# Altium integrated library PlantiumIntegratedLibrary.IntLib: 638 symbols (part 2 of 6)
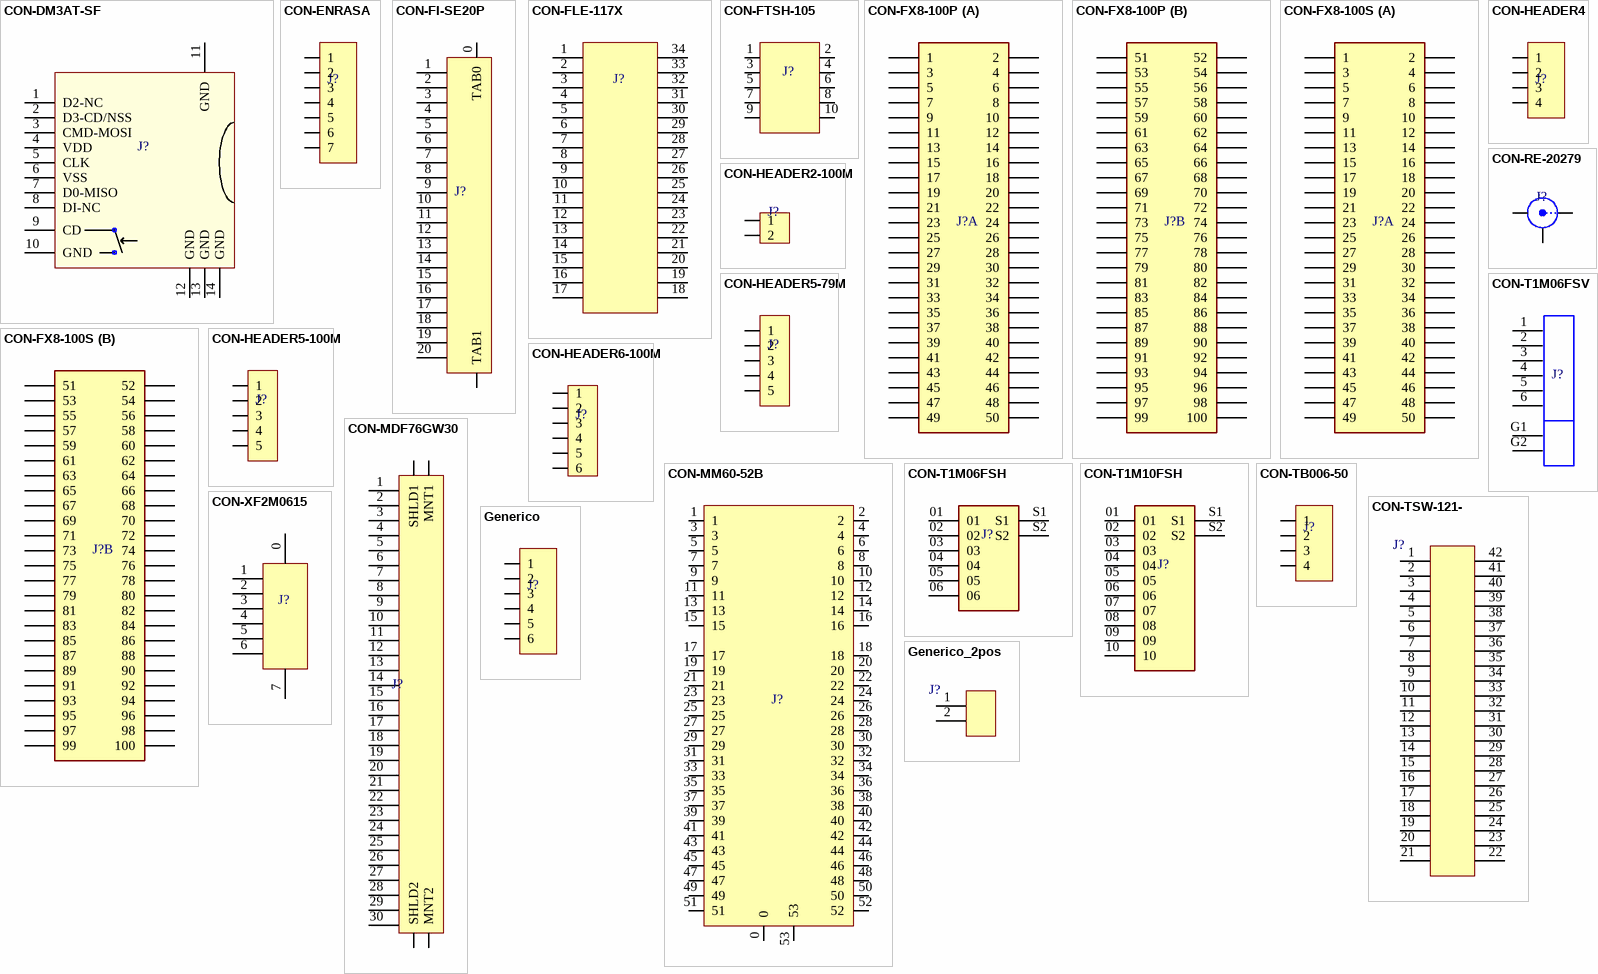
[diagram p35: symbols CON-DM3AT-SF to Generico_2pos]

## CON-MDF76GW30
designator J?
30 Position Receptacle Connector 0.039" (1.00mm) Surface Mount, Right Angle Gold; Manufacturer Part Number: MDF76GW-30S-1H(55); Manufacturer: Hirose Electric Co Ltd; Working Temperature: -40°C ~ 85°C; Temperature Coefficient: NC; Short Description: CONN RCPT 30P 0.039 GOLD SMD R/A; Ratings: ROHS; Value: 30; Mounting: SMT; Power: NC; Type: NC; Frequency: NC; Alternate Part Number 1: NC; Alternate Part Number 2: NC; Tolerance: NC; Current: NC; Revision Date: 19/11/21; Package Reference: NC; Voltage: NC
footprint MDF76GW-30S-1H(55)
pins: 1, 2, 3, 4, 5, 6, 7, 8, 9, 10, 11, 12, 13, 14, 15, 16, 17, 18, 19, 20, 21, 22, 23, 24, 25, 26, 27, 28, 29, 30, 31 MNT1, 31 MNT2, 31 SHLD1, 31 SHLD2

## CON-MM60-52B
designator J?
52 Position Female Connector PCI Express Mini Card Gold 0.031" (0.80mm) -; Manufacturer Part Number: MM60-52B1-E1-R650; Manufacturer: JAE Electronics; Working Temperature: -40°C ~ 85°C; Temperature Coefficient: NC; Short Description: CONN PCI EXP MINI FEMALE 52POS; Ratings: ROHS; Value: 52; Mounting: SMT; Power: NC; Type: NC; Frequency: NC; Alternate Part Number 2: *; Tolerance: NC; Current: NC; Revision Date: 03/08/21; Package Reference: NC; Voltage: NC
footprint MM60-52B1-E1-R650
pins: 0, 1, 2, 3, 4, 5, 6, 7, 8, 9, 10, 11, 12, 13, 14, 15, 16, 17, 18, 19, 20, 21, 22, 23, 24, 25, 26, 27, 28, 29, 30, 31, 32, 33, 34, 35, 36, 37, 38, 39, 40, 41, 42, 43, 44, 45, 46, 47, 48, 49, 50, 51, 52, 53

## CON-RE-20279
designator J?
U.FL (UMCC), IPEX MHF1 Connector Receptacle, Male Pin 50Ohm Surface Mount Solder; Manufacturer Part Number: RECE.20279.001E.01; Manufacturer: Taoglas Limited; Working Temperature: -40°C ~ 90°C; Temperature Coefficient: NC; Short Description: CONN UMC RCPT STR 50 OHM SMD; Ratings: REACH, ROHS3; Frequency: 6GHz; Value: 1; Mounting: SMT; Power: NC; Type: Male; Alternate Part Number 2: *; Tolerance: NC; Current: NC; Revision Date: 03/08/21; Package Reference: NC; Voltage: NC
footprint RECE-20279-001E-01
pins: 1 GND, 2 PIN, 3 GND

## CON-T1M06FSH
designator J?
Connector Header Surface Mount, Right Angle 6 position 0.039" (1.00mm); Manufacturer Part Number: T1M-06-F-SH-L-K; Manufacturer: Samtec Inc.; Working Temperature: -55°C ~ 85°C; Temperature Coefficient: NC; Short Description: CONN HEADER SMD R/A 6POS 1MM; Ratings: REACH, ROHS3; Current: 3.3A; Voltage: 250VAC, 353VDC; Value: 6; Mounting: SMT; Power: NC; Type: NC; Frequency: NC; Alternate Part Number 2: *; Tolerance: NC; Revision Date: 02/02/22; Package Reference: NC; ComponentLink1Description: Series Datasheet; ComponentLink1URL: http://suddendocs.samtec.com/catalog_english/t1m-sx.pdf; ComponentLink2Description: Drawing; ComponentLink2URL: http://suddendocs.samtec.com/prints/t1m-xx-x-sh-l-x-mkt.pdf
footprint T1M-06-X-SH-L
pins: 01, 02, 03, 04, 05, 06, S1, S2

## CON-T1M06FSV
designator J?
Connector Header Surface Mount 6 position 0.039" (1.00mm); Manufacturer Part Number: T1M-06-F-SV-L; Manufacturer: Samtec Inc.; Working Temperature: -55°C ~ 85°C; Temperature Coefficient: NC; Short Description: CONN HEADER SMD 6POS 1MM; Ratings: REACH, ROHS3; Current: 3.3A; Voltage: 250VAC, 353VDC; Value: 6; Mounting: SMT; Power: NC; Type: NC; Frequency: NC; Alternate Part Number 2: *; Tolerance: NC; Revision Date: 03/08/21; Package Reference: NC
footprint T1M-06-F-SV-L
pins: 1, 2, 3, 4, 5, 6, G1, G2

## CON-T1M10FSH
designator J?
Connector Header Surface Mount, Right Angle 10 position 0.039" (1.00mm); Manufacturer Part Number: T1M-10-F-SH-L-K; Manufacturer: Samtec Inc.; Working Temperature: -55°C ~ 85°C; Short Description: CONN HEADER SMD R/A 10POS 1MM; Ratings: ROHS3, REACH; Current: 3.3A; Voltage: 250VAC, 353VDC; Value: 10; Temperature Coefficient: *; Mounting: SMT, R/A; Power: *; Type: Header Male Pin; Frequency: *; Alternate Part Number 1: *; Alternate Part Number 2: *; Tolerance: *; Revision Date: 02/02/2022; Package Reference: *; ComponentLink1Description: Series Datasheet; ComponentLink1URL: http://suddendocs.samtec.com/catalog_english/t1m-sx.pdf; ComponentLink2Description: Drawing; ComponentLink2URL: http://suddendocs.samtec.com/prints/t1m-xx-x-sh-l-x-mkt.pdf
footprint T1M-10-F-SH-L-K (CONN HEADER SMD R/A 10POS 1MM)
pins: 01, 02, 03, 04, 05, 06, 07, 08, 09, 10, S1, S2

## CON-TB006-50
designator J?
4 Position Wire to Board Terminal Block Horizontal with Board 0.200" (5.08mm) Through Hole; Manufacturer Part Number: TB006-508-04BE; Manufacturer: CUI Devices; Working Temperature: -40°C ~ 105°C; Short Description: TERMINAL BLOCK, SCREW TYPE, 5.08; Current: 12 A; Voltage: 300 V; Temperature Coefficient: *; Mounting: Through Hole; Power: *; Ratings: *; Type: *; Frequency: *; Alternate Part Number 1: *; Alternate Part Number 2: *; Tolerance: *; Revision Date: 06/10/2021; Package Reference: *; Value: *
footprint TB006-508-04BE (4 POS, TERMINAL BLOCK, SCREW TYPE, 5.08)
pins: 1, 2, 3, 4

## CON-TSW-121-
designator J?
Connector Header Through Hole 42 position 0.100" (2.54mm) 2 rows; Manufacturer Part Number: TSW-121-07-T-D; Manufacturer: Samtec Inc.; Value: 42; Working Temperature: *; Temperature Coefficient: *; Mounting: Through Hole; Short Description: *; Power: *; Ratings: *; Type: *; Frequency: *; Alternate Part Number 1: *; Alternate Part Number 2: *; Tolerance: *; Current: *; Revision Date: *; Package Reference: *; Voltage: *
footprint PinHeader2x21_2.54
pins: 1, 2, 3, 4, 5, 6, 7, 8, 9, 10, 11, 12, 13, 14, 15, 16, 17, 18, 19, 20, 21, 22, 23, 24, 25, 26, 27, 28, 29, 30, 31, 32, 33, 34, 35, 36, 37, 38, 39, 40, 41, 42

## CON-XF2M0615
designator J?
6 Position FPC Connector Contacts, Top and Bottom 0.020" (0.50mm) Surface Mount, Right Angle; Manufacturer Part Number: XF2M-0615-1A; Manufacturer: Omron Electronics Inc-EMC Div; Working Temperature: -30°C ~ 85°C; Temperature Coefficient: NC; Short Description: CONN FPC 6POS 0.50MM R/A; Ratings: ROHS; Current: 0.5A; Voltage: 50V; Value: 6; Mounting: SMT; Power: NC; Type: NC; Frequency: NC; Alternate Part Number 2: *; Tolerance: NC; Revision Date: 03/08/21; Package Reference: NC
footprint XF2M-0615-1A
pins: 0, 1, 2, 3, 4, 5, 6, 7

## Generico
designator J?
Manufacturer Part Number: *; Working Temperature: *; Temperature Coefficient: *; Mounting: *; Short Description: *; Power: *; Ratings: *; Type: *; Frequency: *; Alternate Part Number 1: *; Alternate Part Number 2: *; Manufacturer: *; Tolerance: *; Current: *; Revision Date: *; Package Reference: *; Voltage: *; Value: *
pins: 1, 2, 3, 4, 5, 6

## Generico_2pos
designator J?
Value: 2; Manufacturer Part Number: *; Working Temperature: *; Temperature Coefficient: *; Mounting: *; Short Description: *; Power: *; Ratings: *; Type: *; Frequency: *; Alternate Part Number 1: *; Alternate Part Number 2: *; Manufacturer: *; Tolerance: *; Current: *; Revision Date: *; Package Reference: *; Voltage: *
footprint HEADER2-100
pins: 1, 2


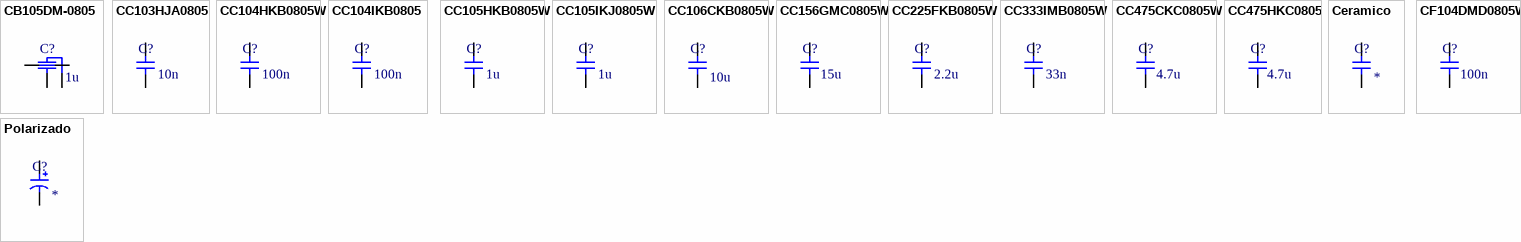
[diagram p7: symbols CB105DM-0805 to Polarizado]

## CB105DM-0805
designator C?  value 1u
Feed Through Capacitor 16V 20mOhm 0805 (2012 Metric), 3 PC Pad; Manufacturer Part Number: NFM21HC105R1C3D; Manufacturer: Murata Electronics; Working Temperature: -55°C ~ 125°C; Short Description: CAP FEEDTHRU 1UF 20% 16V 0805; Power: NC; Type: MLCC; Tolerance: 20%; Current: 4 A; Temperature Coefficient: -; Mounting: SMT; Ratings: AEC-Q200; Frequency: NC; Alternate Part Number 1: *; Alternate Part Number 2: *; Revision Date: 22/09/21; Package Reference: 0805; Voltage: 16V
footprint C0805-4PC
pins: 1, 2, 3, 4

## CC103HJA0805
designator C?  value 10n
10000 pF ±5% 50V Ceramic Capacitor C0G, NP0 0805 (2012 Metric); Manufacturer Part Number: CGA4C2C0G1H103J060AA; Manufacturer: TDK Corporation; Working Temperature: -55°C ~ 125°C; Short Description: CAP CER 10000PF 50V C0G 0805; Power: NC; Type: MLCC; Temperature Coefficient: C0G, NP0; Mounting: SMT; Ratings: AEC-Q200; Frequency: NC; Alternate Part Number 1: *; Alternate Part Number 2: *; Tolerance: ±5%; Current: NC; Revision Date: 17/09/21; Package Reference: 0805; Voltage: 50V
footprint C0805 (Footprint not found)
pins: 1, 2

## CC104HKB0805W
designator C?  value 100n
100 nF ±10% 50V Ceramic Capacitor X7R 0805 (2012 Metric); Manufacturer Part Number: GRM21BR71H104KA01L; Manufacturer: Murata Electronics; Working Temperature: -55°C ~ 125°C; Short Description: CAP CER 0.1UF 50V X7R 0805; Power: NC; Ratings: REACH, ROHS3; Type: MLCC; Temperature Coefficient: X7R; Mounting: SMT; Frequency: NC; Alternate Part Number 1: *; Alternate Part Number 2: *; Tolerance: ±10%; Current: NC; Revision Date: 03/08/21; Package Reference: 0805; Voltage: 50V
footprint C0805 (Footprint not found)
pins: 1, 2

## CC104IKB0805
designator C?  value 100n
100 nF ±10% 100V Ceramic Capacitor X7R 0805 (2012 Metric); Manufacturer Part Number: GCM21BR72A104KA37L; Manufacturer: Murata Electronics; Working Temperature: -55°C ~ 125°C; Short Description: CAP CER 0.1UF 100V X7R 0805; Power: NC; Ratings: REACH, ROHS3, AEC-Q200; Type: MLCC; Temperature Coefficient: X7R; Mounting: SMT; Frequency: NC; Alternate Part Number 1: *; Alternate Part Number 2: *; Tolerance: ±10%; Current: NC; Revision Date: 03/08/21; Package Reference: 0805; Voltage: 100V
footprint C0805 (Footprint not found)
pins: 1, 2

## CC105HKB0805W
designator C?  value 1u
1 µF ±10% 50V Ceramic Capacitor X7R 0805 (2012 Metric); Manufacturer Part Number: C0805C105K5RACTU; Manufacturer: KEMET; Working Temperature: -55°C ~ 125°C; Short Description: CAP CER 1UF 50V X7R 0805; Power: NC; Ratings: REACH, ROHS3; Type: MLCC; Temperature Coefficient: X7R; Mounting: SMT; Frequency: NC; Alternate Part Number 1: *; Alternate Part Number 2: *; Tolerance: ±10%; Current: NC; Revision Date: 03/08/21; Package Reference: 0805; Voltage: 50V
footprint C0805 (Footprint not found)
pins: 1, 2

## CC105IKJ0805W
designator C?  value 1u
1 µF ±10% 100V Ceramic Capacitor X7S 0805 (2012 Metric); Manufacturer Part Number: C2012X7S2A105K125AB; Manufacturer: TDK Corporation; Working Temperature: -55°C ~ 125°C; Short Description: CAP CER 1UF 100V X7S 0805; Power: NC; Ratings: REACH, ROHS3; Type: MLCC; Temperature Coefficient: X7S; Mounting: SMT; Frequency: NC; Alternate Part Number 1: *; Alternate Part Number 2: *; Tolerance: ±10%; Current: NC; Revision Date: 03/08/21; Package Reference: 0805; Voltage: 100V
footprint C0805 (Footprint not found)
pins: 1, 2

## CC106CKB0805W
designator C?  value 10u
10 µF ±10% 10V Ceramic Capacitor X7R 0805 (2012 Metric); Manufacturer Part Number: CL21B106KPQNNNE; Manufacturer: Samsung Electro-Mechanics; Working Temperature: -55°C ~ 125°C; Short Description: CAP CER 10UF 10V X7R 0805; Power: NC; Type: MLCC; Temperature Coefficient: X7R; Mounting: SMT; Ratings: *; Frequency: NC; Alternate Part Number 1: *; Alternate Part Number 2: *; Tolerance: ±10%; Current: NC; Revision Date: 03/08/21; Package Reference: 0805; Voltage: 10V
footprint C0805 (Footprint not found)
pins: 1, 2

## CC156GMC0805W
designator C?  value 15u
15 µF ±20% 35V Ceramic Capacitor X5R 0805 (2012 Metric); Manufacturer Part Number: C2012X5R1V156M125AC; Manufacturer: TDK Corporation; Working Temperature: -55°C ~ 85°C; Short Description: CAP CER 15UF 35V X5R 0805; Power: NC; Ratings: REACH, ROHS3; Type: MLCC; Temperature Coefficient: X5R; Mounting: SMT; Frequency: NC; Alternate Part Number 1: *; Alternate Part Number 2: *; Tolerance: ±20%; Current: NC; Revision Date: 03/08/21; Package Reference: 0805; Voltage: 35V
footprint C0805 (Footprint not found)
pins: 1, 2

## CC225FKB0805W
designator C?  value 2.2u
2.2 µF ±10% 25V Ceramic Capacitor X7R 0805 (2012 Metric); Manufacturer Part Number: CL21B225KAFNFNE; Manufacturer: Samsung Electro-Mechanics; Working Temperature: -55°C ~ 125°C; Short Description: CAP CER 2.2UF 25V X7R 0805; Power: NC; Ratings: ROHS3/REACH; Type: MLCC; Temperature Coefficient: X7R; Mounting: SMT; Frequency: NC; Alternate Part Number 1: *; Alternate Part Number 2: *; Tolerance: ±10%; Current: NC; Revision Date: 18/04/23; Package Reference: 0805; Voltage: 25V
footprint C0805 (Footprint not found)
pins: 1, 2

## CC333IMB0805W
designator C?  value 33n
33 nF ±20% 100V Ceramic Capacitor X7R 0805 (2012 Metric); Manufacturer Part Number: C2012X7R2A333M; Manufacturer: TDK Corporation; Working Temperature: -55°C ~ 125°C; Short Description: CAP CER 0.033UF 100V X7R 0805; Power: NC; Ratings: REACH, ROHS3; Type: MLCC; Temperature Coefficient: X7R; Mounting: SMT; Frequency: NC; Alternate Part Number 1: *; Alternate Part Number 2: *; Tolerance: ±20%; Current: NC; Revision Date: 03/08/21; Package Reference: 0805; Voltage: 100V
footprint C0805 (Footprint not found)
pins: 1, 2

## CC475CKC0805W
designator C?  value 4.7u
4.7 µF ±10% 10V Ceramic Capacitor X7R 0805 (2012 Metric); Manufacturer Part Number: LMK212B7475KG-T; Manufacturer: Taiyo Yuden; Working Temperature: -55°C ~ 125°C; Short Description: CAP CER 4.7UF 10V X7R 0805; Power: NC; Ratings: REACH, ROHS3; Type: MLCC; Temperature Coefficient: X7R; Mounting: SMT; Frequency: NC; Alternate Part Number 1: *; Alternate Part Number 2: *; Tolerance: ±10%; Current: NC; Revision Date: 03/08/21; Package Reference: 0805; Voltage: 10V
footprint C0805 (Footprint not found)
pins: 1, 2

## CC475HKC0805
designator C?  value 4.7u
4.7 µF ±10% 50V Ceramic Capacitor X5R 0805 (2012 Metric); Manufacturer Part Number: GRT21BR61H475KE13L; Manufacturer: Murata Electronics; Working Temperature: -55°C ~ 85°C; Short Description: CAP CER 4.7UF 50V X5R 0805; Power: NC; Ratings: REACH, ROHS3, AEC-Q200; Type: MLCC; Temperature Coefficient: X5R; Mounting: SMT; Frequency: NC; Alternate Part Number 1: *; Alternate Part Number 2: *; Tolerance: ±10%; Current: NC; Revision Date: 03/08/21; Package Reference: 0805; Voltage: 50V
footprint C0805 (Footprint not found)
pins: 1, 2

## Ceramico
designator C?
Power: NC; Type: MLCC; Manufacturer Part Number: *; Working Temperature: *; Temperature Coefficient: *; Mounting: SMT; Short Description: *; Ratings: *; Frequency: NC; Alternate Part Number 1: *; Alternate Part Number 2: *; Manufacturer: *; Tolerance: *; Current: NC; Revision Date: 03/08/21; Package Reference: 0805; Voltage: *; Value: *
footprint C0805 (Footprint not found)
pins: 1, 2

## CF104DMD0805W
designator C?  value 100n
100 nF Film Capacitor 12V 16V Acrylic, Metallized 0805 (2012 Metric); Manufacturer Part Number: FCA0805C104M-J2; Manufacturer: Cornell Dubilier Electronics (CDE); Working Temperature: -40°C ~ 85°C; Temperature Coefficient: Y5V; Short Description: CAP FILM 0.1UF 20% 16VDC 0805; Power: NC; Ratings: REACH, ROHS3; Tolerance: ±20%; Mounting: SMT; Type: Film; Frequency: NC; Alternate Part Number 1: *; Alternate Part Number 2: *; Current: NC; Revision Date: 03/08/21; Package Reference: 0805; Voltage: 16V
footprint C0805 (Footprint not found)
pins: 1, 2

## Polarizado
designator C?
Power: NC; Type: MLCC; Manufacturer Part Number: *; Working Temperature: *; Temperature Coefficient: *; Mounting: SMT; Short Description: *; Ratings: *; Frequency: NC; Alternate Part Number 1: *; Alternate Part Number 2: *; Manufacturer: *; Tolerance: *; Current: NC; Revision Date: 03/08/21; Package Reference: 0805; Voltage: *; Value: *
footprint C0805 (Footprint not found)
pins: 1, 2


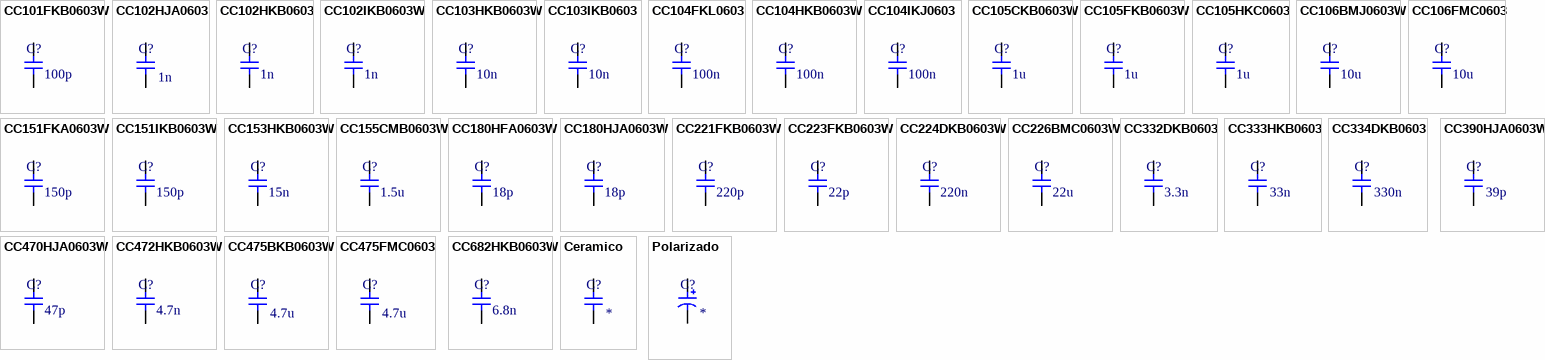
[diagram p8: symbols CC101FKB0603W to Polarizado]

## CC101FKB0603W
designator C?  value 100p
100 pF ±10% 25V Ceramic Capacitor X7R 0603 (1608 Metric); Manufacturer Part Number: 06033C101KAT2A; Manufacturer: AVX Corporation; Working Temperature: -55°C ~ 125°C; Short Description: CAP CER 100PF 25V X7R 0603; Power: NC; Ratings: REACH, ROHS3; Type: MLCC; Temperature Coefficient: X7R; Mounting: SMT; Frequency: NC; Alternate Part Number 1: *; Alternate Part Number 2: *; Tolerance: ±10%; Current: NC; Revision Date: 02/08/21; Package Reference: 0603; Voltage: 25V
footprint C0603 (Footprint not found)
pins: 1, 2

## CC102HJA0603
designator C?  value 1n
1 nF ±5% 50V Ceramic Capacitor C0G, NP0 0603 (1608 Metric); Manufacturer Part Number: CL10C102JB81PNC; Manufacturer: Samsung Electro-Mechanics; Working Temperature: -55°C ~ 125°C; Short Description: CAP CER 1000PF 50V C0G/NP0 0603; Power: NC; Type: MLCC; Temperature Coefficient: C0G, NP0; Mounting: SMT; Ratings: AEC-Q200; Frequency: NC; Alternate Part Number 1: *; Alternate Part Number 2: *; Tolerance: ±5%; Current: NC; Revision Date: 17/09/21; Package Reference: 0603; Voltage: 50V
footprint C0603 (Footprint not found)
pins: 1, 2

## CC102HKB0603
designator C?  value 1n
1 nF ±10% 50V Ceramic Capacitor X7R 0603 (1608 Metric); Manufacturer Part Number: GCM188R71H102KA37D; Manufacturer: Murata Electronics; Working Temperature: -55°C ~ 125°C; Short Description: CAP CER 1000PF 50V X7R 0603; Power: NC; Ratings: REACH, ROHS3, AEC-Q200; Type: MLCC; Temperature Coefficient: X7R; Mounting: SMT; Frequency: NC; Alternate Part Number 1: *; Alternate Part Number 2: *; Tolerance: ±10%; Current: NC; Revision Date: 02/08/21; Package Reference: 0603; Voltage: 50V
footprint C0603 (Footprint not found)
pins: 1, 2

## CC102IKB0603W
designator C?  value 1n
1 nF ±10% 100V Ceramic Capacitor X7R 0603 (1608 Metric); Manufacturer Part Number: CL10B102KC8NNNC; Manufacturer: Samsung Electro-Mechanics; Working Temperature: -55°C ~ 125°C; Short Description: CAP CER 1000PF 100V X7R 0603; Power: NC; Ratings: REACH, ROHS3; Type: MLCC; Temperature Coefficient: X7R; Mounting: SMT; Frequency: NC; Alternate Part Number 1: *; Alternate Part Number 2: *; Tolerance: ±10%; Current: NC; Revision Date: 02/08/21; Package Reference: 0603; Voltage: 100V
footprint C0603 (Footprint not found)
pins: 1, 2

## CC103HKB0603W
designator C?  value 10n
10 nF ±10% 50V Ceramic Capacitor X7R 0603 (1608 Metric); Manufacturer Part Number: C0603C103K5RACTU; Manufacturer: KEMET; Working Temperature: -55°C ~ 125°C; Short Description: CAP CER 10000PF 50V X7R 0603; Power: NC; Ratings: REACH, ROHS3; Type: MLCC; Temperature Coefficient: X7R; Mounting: SMT; Frequency: NC; Alternate Part Number 1: *; Alternate Part Number 2: *; Tolerance: ±10%; Current: NC; Revision Date: 02/08/21; Package Reference: 0603; Voltage: 50V
footprint C0603 (Footprint not found)
pins: 1, 2

## CC103IKB0603
designator C?  value 10n
10 nF ±10% 100V Ceramic Capacitor X7R 0603 (1608 Metric); Manufacturer Part Number: CGA3E2X7R2A103K080AA; Manufacturer: TDK Corporation; Working Temperature: -55°C ~ 125°C; Short Description: CAP CER 10000PF 100V X7R 0603; Power: NC; Ratings: REACH, ROHS3; Type: MLCC; Temperature Coefficient: X7R; Mounting: SMT; Frequency: NC; Alternate Part Number 1: *; Alternate Part Number 2: *; Tolerance: ±10%; Current: NC; Revision Date: 02/08/21; Package Reference: 0603; Voltage: 100V
footprint C0603 (Footprint not found)
pins: 1, 2

## CC104FKL0603
designator C?  value 100n  (hidden comment: CC104FKL0603)
100 nF ±10% 25V Ceramic Capacitor X8R 0603 (1608 Metric); Manufacturer Part Number: C1608X8R1E104K080AA; Manufacturer: TDK Corporation; Working Temperature: -55°C ~ 150°C; Short Description: CAP CER 0.1UF 25V X8R 0603; Power: NC; Ratings: REACH, ROHS3; Type: MLCC; Voltage: 50V; Temperature Coefficient: X8R; Mounting: SMT; Frequency: NC; Alternate Part Number 1: *; Alternate Part Number 2: *; Tolerance: ±10%; Current: NC; Revision Date: 02/08/21; Package Reference: 0603
footprint C0603
pins: 1, 2

## CC104HKB0603W
designator C?  value 100n
100 nF ±10% 50V Ceramic Capacitor X7R 0603 (1608 Metric); Manufacturer Part Number: C0603C104K5RACTU; Manufacturer: KEMET; Working Temperature: -55°C ~ 125°C; Short Description: CAP CER 0.1UF 50V X7R 0603; Power: NC; Ratings: REACH, ROHS3; Type: MLCC; Temperature Coefficient: X7R; Mounting: SMT; Frequency: NC; Alternate Part Number 1: *; Alternate Part Number 2: *; Tolerance: ±10%; Current: NC; Revision Date: 02/08/21; Package Reference: 0603; Voltage: 50V
footprint C0603 (Footprint not found)
pins: 1, 2

## CC104IKJ0603
designator C?  value 100n
100 nF ±10% 100V Ceramic Capacitor X7S 0603 (1608 Metric); Manufacturer Part Number: CGA3E3X7S2A104K080AB; Manufacturer: TDK Corporation; Working Temperature: -55°C ~ 125°C; Short Description: CAP CER 0.1UF 100V X7S 0603; Power: NC; Ratings: REACH, ROHS3, AEC-Q200; Type: MLCC; Temperature Coefficient: X7S; Mounting: SMT; Frequency: NC; Alternate Part Number 1: *; Alternate Part Number 2: *; Tolerance: ±10%; Current: NC; Revision Date: 02/08/21; Package Reference: 0603; Voltage: 100V
footprint C0603 (Footprint not found)
pins: 1, 2

## CC105CKB0603W
designator C?  value 1u
1 µF ±10% 10V Ceramic Capacitor X7R 0603 (1608 Metric); Manufacturer Part Number: LMK107B7105KA-T; Alternate Part Number 2: CL10B105KP8NNNC; Manufacturer: Taiyo Yuden; Working Temperature: -55°C ~ 125°C; Short Description: CAP CER 1UF 10V X7R 0603; Power: NC; Ratings: REACH, ROHS3; Type: MLCC; Temperature Coefficient: X7R; Mounting: SMT; Frequency: NC; Alternate Part Number 1: *; Tolerance: ±10%; Current: NC; Revision Date: 12/11/21; Package Reference: 0603; Voltage: 10V
footprint C0603 (Footprint not found)
pins: 1, 2

## CC105FKB0603W
designator C?  value 1u
1 µF ±10% 25V Ceramic Capacitor X7R 0603 (1608 Metric); Manufacturer Part Number: C0603C105K3RACTU; Manufacturer: KEMET; Working Temperature: -55°C ~ 125°C; Short Description: CAP CER 1UF 25V X7R 0603; Power: NC; Ratings: REACH, ROHS3; Type: MLCC; Temperature Coefficient: X7R; Mounting: SMT; Frequency: NC; Alternate Part Number 1: *; Alternate Part Number 2: *; Tolerance: ±10%; Current: NC; Revision Date: 02/08/21; Package Reference: 0603; Voltage: 25V
footprint C0603 (Footprint not found)
pins: 1, 2

## CC105HKC0603
designator C?  value 1u
1 µF ±10% 50V Ceramic Capacitor X5R 0603 (1608 Metric); Manufacturer Part Number: CGA3E3X5R1H105K080AB; Manufacturer: TDK Corporation; Working Temperature: -55°C ~ 85°C; Short Description: CAP CER 1UF 50V X5R 0603; Power: NC; Ratings: REACH, ROHS3, AEC-Q200; Type: MLCC; Temperature Coefficient: X5R; Mounting: SMT; Frequency: NC; Alternate Part Number 1: *; Alternate Part Number 2: *; Tolerance: ±10%; Current: NC; Revision Date: 02/08/21; Package Reference: 0603; Voltage: 50V
footprint C0603 (Footprint not found)
pins: 1, 2

## CC106BMJ0603W
designator C?  value 10u
10 µF ±20% 6.3V Ceramic Capacitor X7S 0603 (1608 Metric); Manufacturer Part Number: C1608X7S0J106M080AC; Manufacturer: TDK Corporation; Working Temperature: -55°C ~ 125°C; Short Description: CAP CER 10UF 6.3V X7S 0603; Power: NC; Ratings: REACH, ROHS3; Type: MLCC; Temperature Coefficient: X7S; Mounting: SMT; Frequency: NC; Alternate Part Number 1: *; Alternate Part Number 2: *; Tolerance: ±20%; Current: NC; Revision Date: 02/08/21; Package Reference: 0603; Voltage: 6.3V
footprint C0603 (Footprint not found)
pins: 1, 2

## CC106FMC0603
designator C?  value 10u
10 µF ±20% 25V Ceramic Capacitor X5R 0603 (1608 Metric); Manufacturer Part Number: GRT188R61E106ME13D; Manufacturer: Murata Electronics; Working Temperature: -55°C ~ 85°C; Short Description: CAP CER 10UF 25V X5R 0603; Power: NC; Ratings: AEC-Q200, ROHS3; Type: MLCC; Temperature Coefficient: X5R; Mounting: SMT; Frequency: NC; Alternate Part Number 1: *; Alternate Part Number 2: *; Tolerance: ±20%; Current: NC; Revision Date: 18/04/23; Package Reference: 0603; Voltage: 25V
footprint C0603 (Footprint not found)
pins: 1, 2

## CC151FKA0603W
designator C?  value 150p
150 pF ±10% 25V Ceramic Capacitor C0G, NP0 0603 (1608 Metric); Manufacturer Part Number: C0603C151K3GACTU; Manufacturer: KEMET; Working Temperature: -55°C ~ 125°C; Temperature Coefficient: C0G/NP0; Short Description: CAP CER 150PF 25V C0G/NP0 0603; Power: NC; Ratings: REACH, ROHS3; Type: MLCC; Mounting: SMT; Frequency: NC; Alternate Part Number 1: *; Alternate Part Number 2: *; Tolerance: ±10%; Current: NC; Revision Date: 02/08/21; Package Reference: 0603; Voltage: 25V
footprint C0603 (Footprint not found)
pins: 1, 2

## CC151IKB0603W
designator C?  value 150p  (hidden comment: CC151IKB0603W)
150 pF ±10% 100V Ceramic Capacitor X7R 0603 (1608 Metric); Manufacturer Part Number: 885012206103; Manufacturer: Würth Elektronik; Working Temperature: -55°C ~ 125°C; Temperature Coefficient: C0G/NP0; Short Description: CAP CER 150PF 100V X7R 0603; Power: NC; Ratings: REACH, ROHS3; Type: MLCC; Mounting: SMT; Frequency: NC; Alternate Part Number 1: *; Alternate Part Number 2: *; Tolerance: ±10%; Current: NC; Revision Date: 02/08/21; Package Reference: 0603; Voltage: 100V
footprint C0603
pins: 1, 2

## CC153HKB0603W
designator C?  value 15n
15 nF ±10% 50V Ceramic Capacitor X7R 0603 (1608 Metric); Manufacturer Part Number: CL10B153KB8NNNC; Manufacturer: Samsung Electro-Mechanics; Working Temperature: -55°C ~ 125°C; Short Description: CAP CER 0.015UF 50V X7R 0603; Power: NC; Ratings: REACH, ROHS3; Type: MLCC; Temperature Coefficient: X7R; Mounting: SMT; Frequency: NC; Alternate Part Number 1: *; Alternate Part Number 2: *; Tolerance: ±10%; Current: NC; Revision Date: 02/08/21; Package Reference: 0603; Voltage: 50V
footprint C0603 (Footprint not found)
pins: 1, 2

## CC155CMB0603W
designator C?  value 1.5u
1.5 µF ±20% 10V Ceramic Capacitor X7R 0603 (1608 Metric); Manufacturer Part Number: C1608X7R1A155M080AC; Manufacturer: TDK Corporation; Working Temperature: -55°C ~ 125°C; Short Description: CAP CER 1.5UF 10V X7R 0603; Power: NC; Ratings: REACH, ROHS3; Type: MLCC; Temperature Coefficient: X7R; Mounting: SMT; Frequency: NC; Alternate Part Number 1: *; Alternate Part Number 2: *; Tolerance: ±20%; Current: NC; Revision Date: 02/08/21; Package Reference: 0603; Voltage: 10V
footprint C0603 (Footprint not found)
pins: 1, 2

## CC180HFA0603W
designator C?  value 18p
18 pF ±1% 50V Ceramic Capacitor C0G, NP0 0603 (1608 Metric); Manufacturer Part Number: CL10C180FB8NNNC; Manufacturer: Samsung Electro-Mechanics; Working Temperature: -55°C ~ 125°C; Temperature Coefficient: C0G/NP0; Short Description: CAP CER 18PF 50V C0G/NP0 0603; Power: NC; Ratings: REACH, ROHS3; Type: MLCC; Mounting: SMT; Frequency: NC; Alternate Part Number 1: *; Alternate Part Number 2: *; Tolerance: ±1%; Current: NC; Revision Date: 02/08/21; Package Reference: 0603; Voltage: 50V
footprint C0603 (Footprint not found)
pins: 1, 2

## CC180HJA0603W
designator C?  value 18p
18 pF ±5% 50V Ceramic Capacitor C0G, NP0 0603 (1608 Metric); Manufacturer Part Number: C0603C180J5GACTU; Manufacturer: KEMET; Working Temperature: -55°C ~ 125°C; Temperature Coefficient: C0G/NP0; Short Description: CAP CER 18PF 50V C0G/NP0 0603; Power: NC; Ratings: REACH, ROHS3; Type: MLCC; Mounting: SMT; Frequency: NC; Alternate Part Number 1: *; Alternate Part Number 2: *; Tolerance: ±5%; Current: NC; Revision Date: 02/08/21; Package Reference: 0603; Voltage: 50V
footprint C0603 (Footprint not found)
pins: 1, 2

## CC221FKB0603W
designator C?  value 220p
220 pF ±10% 25V Ceramic Capacitor X7R 0603 (1608 Metric); Manufacturer Part Number: C0603C221K3RACTU; Manufacturer: KEMET; Working Temperature: -55°C ~ 125°C; Short Description: CAP CER 220PF 25V X7R 0603; Power: NC; Ratings: REACH, ROHS3; Type: MLCC; Temperature Coefficient: X7R; Mounting: SMT; Frequency: NC; Alternate Part Number 1: *; Alternate Part Number 2: *; Tolerance: ±10%; Current: NC; Revision Date: 02/08/21; Package Reference: 0603; Voltage: 25V
footprint C0603 (Footprint not found)
pins: 1, 2

## CC223FKB0603W
designator C?  value 22p
0.022 µF ±10% 25V Ceramic Capacitor X7R 0603 (1608 Metric); Manufacturer Part Number: ECJ-1VB1E223K; Alternate Part Number 1: C0603C223K3RAC; Manufacturer: Panasonic Electronic Components; Working Temperature: -55°C ~ 125°C; Short Description: CAP CER 0.022UF 25V X7R 0603; Power: NC; Temperature Coefficient: X7R; Mounting: SMT; Ratings: -; Frequency: NC; Alternate Part Number 2: *; Tolerance: ±10%; Current: NC; Revision Date: 07/11/22; Package Reference: 0603; Voltage: 25V
footprint C0603 (Footprint not found)
pins: 1, 2

## CC224DKB0603W
designator C?  value 220n
220 nF ±10% 16V Ceramic Capacitor X7R 0603 (1608 Metric); Manufacturer Part Number: C1608X7R1C224K080AC; Manufacturer: TDK Corporation; Working Temperature: -55°C ~ 125°C; Short Description: CAP CER 0.22UF 16V X7R 0603; Power: NC; Ratings: REACH, ROHS3; Type: MLCC; Temperature Coefficient: X7R; Mounting: SMT; Frequency: NC; Alternate Part Number 1: *; Alternate Part Number 2: *; Tolerance: ±10%; Current: NC; Revision Date: 02/08/21; Package Reference: 0603; Voltage: 16V
footprint C0603 (Footprint not found)
pins: 1, 2

## CC226BMC0603W
designator C?  value 22u
22 µF ±20% 6.3V Ceramic Capacitor X5R 0603 (1608 Metric); Manufacturer Part Number: C1608X5R0J226M080AC; Manufacturer: TDK Corporation; Working Temperature: -55°C ~ 85°C; Short Description: CAP CER 22UF 6.3V X5R 0603; Power: NC; Ratings: REACH, ROHS3; Type: MLCC; Temperature Coefficient: X5R; Mounting: SMT; Frequency: NC; Alternate Part Number 1: *; Alternate Part Number 2: *; Tolerance: ±20%; Current: NC; Revision Date: 02/08/21; Package Reference: 0603; Voltage: 6.3V
footprint C0603 (Footprint not found)
pins: 1, 2

## CC332DKB0603
designator C?  value 3.3n
3.3 nF ±10% 16V Ceramic Capacitor X7R 0603 (1608 Metric); Manufacturer Part Number: C0603C332K4RACAUTO; Manufacturer: KEMET; Working Temperature: -55°C ~ 125°C; Short Description: CAP CER 3300PF 16V X7R 0603; Power: NC; Ratings: REACH, ROHS3, AEC-Q200; Type: MLCC; Temperature Coefficient: X7R; Mounting: SMT; Frequency: NC; Alternate Part Number 1: *; Alternate Part Number 2: *; Tolerance: ±10%; Current: NC; Revision Date: 02/08/21; Package Reference: 0603; Voltage: 16V
footprint C0603 (Footprint not found)
pins: 1, 2

## CC333HKB0603
designator C?  value 33n
33 nF ±10% 50V Ceramic Capacitor X7R 0603 (1608 Metric); Manufacturer Part Number: GCM188R71H333KA55D; Manufacturer: Murata Electronics; Working Temperature: -55°C ~ 125°C; Short Description: CAP CER 0.033UF 50V X7R 0603; Power: NC; Ratings: REACH, ROHS3, AEC-Q200; Type: MLCC; Temperature Coefficient: X7R; Mounting: SMT; Frequency: NC; Alternate Part Number 1: *; Alternate Part Number 2: *; Tolerance: ±10%; Current: NC; Revision Date: 02/08/21; Package Reference: 0603; Voltage: 50V
footprint C0603 (Footprint not found)
pins: 1, 2

## CC334DKB0603
designator C?  value 330n
330 nF ±10% 16V Ceramic Capacitor X7R 0603 (1608 Metric); Manufacturer Part Number: CGA3E1X7R1C334K; Manufacturer: TDK Corporation; Working Temperature: -55°C ~ 125°C; Short Description: CAP CER 0.33UF 16V X7R 0603; Power: NC; Ratings: REACH, ROHS3, AEC-Q200; Type: MLCC; Temperature Coefficient: X7R; Mounting: SMT; Frequency: NC; Alternate Part Number 1: *; Alternate Part Number 2: *; Tolerance: ±10%; Current: NC; Revision Date: 02/08/21; Package Reference: 0603; Voltage: 16V
footprint C0603 (Footprint not found)
pins: 1, 2

## CC390HJA0603W
designator C?  value 39p
39 pF ±5% 50V Ceramic Capacitor C0G, NP0 0603 (1608 Metric); Manufacturer Part Number: C0603C390J5GACTU; Manufacturer: KEMET; Working Temperature: -55°C ~ 125°C; Temperature Coefficient: C0G/NP0; Short Description: CAP CER 39PF 50V C0G/NP0 0603; Power: NC; Ratings: REACH, ROHS3, AEC-Q200; Type: MLCC; Mounting: SMT; Frequency: NC; Alternate Part Number 1: *; Alternate Part Number 2: *; Tolerance: ±5%; Current: NC; Revision Date: 02/08/21; Package Reference: 0603; Voltage: 50V
footprint C0603 (Footprint not found)
pins: 1, 2

## CC470HJA0603W
designator C?  value 47p
47 pF ±5% 50V Ceramic Capacitor C0G, NP0 0603 (1608 Metric); Manufacturer Part Number: GRM1885C1H470JA01D; Manufacturer: Murata Electronics; Working Temperature: -55°C ~ 125°C; Temperature Coefficient: C0G/NP0; Short Description: CAP CER 47PF 50V C0G/NP0 0603; Power: NC; Ratings: REACH, ROHS3; Type: MLCC; Mounting: SMT; Frequency: NC; Alternate Part Number 1: *; Alternate Part Number 2: *; Tolerance: ±5%; Current: NC; Revision Date: 02/08/21; Package Reference: 0603; Voltage: 50V
footprint C0603 (Footprint not found)
pins: 1, 2

## CC472HKB0603W
designator C?  value 4.7n
4.7 nF ±10% 50V Ceramic Capacitor X7R 0603 (1608 Metric); Manufacturer Part Number: C0603C472K5RACTU; Manufacturer: KEMET; Working Temperature: -55°C ~ 125°C; Short Description: CAP CER 4700PF 50V X7R 0603; Power: NC; Ratings: REACH, ROHS3; Type: MLCC; Temperature Coefficient: X7R; Mounting: SMT; Frequency: NC; Alternate Part Number 1: *; Alternate Part Number 2: *; Tolerance: ±10%; Current: NC; Revision Date: 02/08/21; Package Reference: 0603; Voltage: 50V
footprint C0603 (Footprint not found)
pins: 1, 2

## CC475BKB0603W
designator C?  value 4.7u
4.7 µF ±10% 6.3V Ceramic Capacitor X7R 0603 (1608 Metric); Manufacturer Part Number: CL10B475KQ8NQNC; Manufacturer: Samsung Electro-Mechanics; Working Temperature: -55°C ~ 125°C; Short Description: CAP CER 4.7UF 6.3V X7R 0603; Power: NC; Ratings: REACH, ROHS3; Type: MLCC; Temperature Coefficient: X7R; Mounting: SMT; Frequency: NC; Alternate Part Number 1: *; Alternate Part Number 2: *; Tolerance: ±10%; Current: NC; Revision Date: 02/08/21; Package Reference: 0603; Voltage: 6.3V
footprint C0603 (Footprint not found)
pins: 1, 2

## CC475FMC0603
designator C?  value 4.7u
4.7 µF ±10% 25V Ceramic Capacitor X5R 0603 (1608 Metric); Manufacturer Part Number: GRT188R61E475KE13D; Manufacturer: Murata Electronics; Working Temperature: -55°C ~ 85°C; Temperature Coefficient: X7R; Short Description: CAP CER 4.7UF 25V X5R 0603; Power: NC; Ratings: AEC-Q200, ROHS3; Type: MLCC; Mounting: SMT; Frequency: NC; Alternate Part Number 1: *; Alternate Part Number 2: *; Tolerance: ±10%; Current: NC; Revision Date: 18/04/23; Package Reference: 0603; Voltage: 25V
footprint C0603 (Footprint not found)
pins: 1, 2

## CC682HKB0603W
designator C?  value 6.8n
6.8 nF ±10% 50V Ceramic Capacitor X7R 0603 (1608 Metric); Manufacturer Part Number: C0603C682K5RACTU; Manufacturer: KEMET; Working Temperature: -55°C ~ 125°C; Short Description: CAP CER 6800PF 50V X7R 0603; Power: NC; Ratings: REACH, ROHS3; Type: MLCC; Temperature Coefficient: X7R; Mounting: SMT; Frequency: NC; Alternate Part Number 1: *; Alternate Part Number 2: *; Tolerance: ±10%; Current: NC; Revision Date: 02/08/21; Package Reference: 0603; Voltage: 50V
footprint C0603 (Footprint not found)
pins: 1, 2

## Ceramico
designator C?
Power: NC; Manufacturer Part Number: *; Working Temperature: *; Temperature Coefficient: *; Mounting: SMT; Short Description: *; Ratings: *; Type: *; Frequency: NC; Alternate Part Number 1: *; Alternate Part Number 2: *; Manufacturer: *; Tolerance: *; Current: NC; Revision Date: 02/08/21; Package Reference: 0603; Voltage: *; Value: *
footprint C0603 (Footprint not found)
pins: 1, 2

## Polarizado
designator C?
Power: NC; Manufacturer Part Number: *; Working Temperature: *; Temperature Coefficient: *; Mounting: SMT; Short Description: *; Ratings: *; Type: *; Frequency: NC; Alternate Part Number 1: *; Alternate Part Number 2: *; Manufacturer: *; Tolerance: *; Current: NC; Revision Date: 02/08/21; Package Reference: 0603; Voltage: *; Value: *
footprint C0603 (Footprint not found)
pins: 1, 2


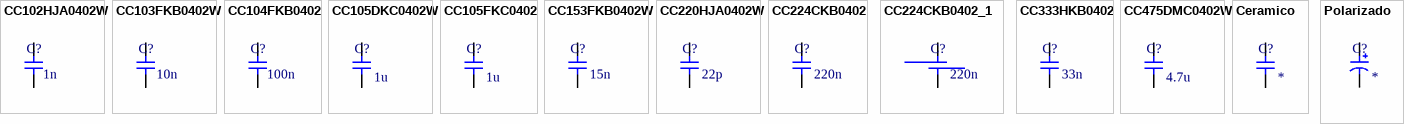
[diagram p9: symbols CC102HJA0402W to Polarizado]

## CC102HJA0402W
designator C?  value 1n
1 nF ±5% 50V Ceramic Capacitor C0G, NP0 0402 (1005 Metric); Manufacturer Part Number: GRM1555C1H102JA01D; Manufacturer: Murata Electronics; Working Temperature: -55°C ~ 125°C; Short Description: CAP CER 1000PF 50V C0G/NP0 0402; Power: NC; Ratings: REACH, ROHS3; Type: MLCC; Temperature Coefficient: C0G, NP0; Mounting: SMT; Frequency: NC; Alternate Part Number 1: *; Alternate Part Number 2: *; Tolerance: ±5%; Current: NC; Revision Date: 02/08/21; Package Reference: 0402; Voltage: 50V
footprint C0402_small
footprint C0402
pins: 1, 2

## CC103FKB0402W
designator C?  value 10n
10 nF ±10% 25V Ceramic Capacitor X7R 0402 (1005 Metric); Manufacturer Part Number: ECJ-0EB1E103K; Manufacturer: Panasonic Electronic Components; Working Temperature: -55°C ~ 125°C; Short Description: CAP CER 10000PF 25V X7R 0402; Power: NC; Type: MLCC; Temperature Coefficient: X7R; Mounting: SMT; Ratings: *; Frequency: NC; Alternate Part Number 1: *; Alternate Part Number 2: *; Tolerance: ±10%; Current: NC; Revision Date: 02/08/21; Package Reference: 0402; Voltage: 25V
footprint C0402 (Footprint not found)
pins: 1, 2

## CC104FKB0402
designator C?  value 100n
100 nF ±10% 25V Ceramic Capacitor X7R 0402 (1005 Metric); Manufacturer Part Number: CGA2B3X7R1E104K; Manufacturer: TDK Corporation; Working Temperature: -55°C ~ 125°C; Short Description: CAP CER 0.1UF 25V X7R 0402; Power: NC; Ratings: REACH, ROHS3, AEC-Q200; Type: MLCC; Temperature Coefficient: X7R; Mounting: SMT; Frequency: NC; Alternate Part Number 1: *; Alternate Part Number 2: *; Tolerance: ±10%; Current: NC; Revision Date: 02/08/21; Package Reference: 0402; Voltage: 25V
footprint C0402 (Footprint not found)
pins: 1, 2

## CC105DKC0402W
designator C?  value 1u
1 µF ±10% 16V Ceramic Capacitor X5R 0402 (1005 Metric); Manufacturer Part Number: CL05A105KO5NNNC; Manufacturer: Samsung Electro-Mechanics; Working Temperature: -55°C ~ 85°C; Short Description: CAP CER 1UF 16V X5R 0402; Power: NC; Ratings: REACH, ROHS3; Type: MLCC; Temperature Coefficient: X5R; Mounting: SMT; Frequency: NC; Alternate Part Number 1: *; Alternate Part Number 2: *; Tolerance: ±10%; Current: NC; Revision Date: 02/08/21; Package Reference: 0402; Voltage: 16V
footprint C0402 (Footprint not found)
pins: 1, 2

## CC105FKC0402
designator C?  value 1u
1 µF ±10% 25V Ceramic Capacitor X5R 0402 (1005 Metric); Manufacturer Part Number: GRT155R61E105KE01D; Manufacturer: Murata Electronics; Working Temperature: -55°C ~ 85°C; Short Description: CAP CER 1UF 25V X5R 0402; Power: NC; Ratings: REACH, ROHS3, AEC-Q200; Type: MLCC; Temperature Coefficient: X5R; Mounting: SMT; Frequency: NC; Alternate Part Number 1: *; Alternate Part Number 2: *; Tolerance: ±10%; Current: NC; Revision Date: 22/12/21; Package Reference: 0402; Voltage: 25V
footprint C0402 (Footprint not found)
pins: 1, 2

## CC153FKB0402W
designator C?  value 15n
0.015 µF ±10% 50V Ceramic Capacitor X7R 0402 (1005 Metric); Manufacturer Part Number: GCM155R71H153KA55D; Manufacturer: Murata Electronics; Working Temperature: -55°C ~ 125°C; Short Description: CAP CER 0.015UF 50V X7R 0402; Power: NC; Type: MLCC; Temperature Coefficient: X7R; Mounting: SMT; Ratings: *; Frequency: NC; Alternate Part Number 1: *; Alternate Part Number 2: *; Tolerance: ±10%; Current: NC; Revision Date: 05/05/23; Package Reference: 0402; Voltage: 50V
footprint C0402_SMALL_SMALL (Footprint not found)
pins: 1, 2

## CC220HJA0402W
designator C?  value 22p
22 pF ±5% 50V Ceramic Capacitor C0G, NP0 0402 (1005 Metric); Manufacturer Part Number: GRM1555C1H220JA01D; Manufacturer: Murata Electronics; Working Temperature: -55°C ~ 125°C; Short Description: CAP CER 22PF 50V C0G/NP0 0402; Power: NC; Type: MLCC; Temperature Coefficient: C0G, NP0; Mounting: SMT; Ratings: *; Frequency: NC; Alternate Part Number 1: *; Alternate Part Number 2: *; Tolerance: ±5%; Current: NC; Revision Date: 02/08/21; Package Reference: 0402; Voltage: 50V
footprint C0402 (Footprint not found)
footprint C0402_small
pins: 1, 2
